# Altium footprint library PERCRO_footprints.PcbLib: 177 footprints (part 9 of 12)
Each footprint in its own frame and in the unit in brackets; x right, y up, seen from the top. Pads: shape width x height; smd on the part's side, far side on the other; paste and mask are expansions set on the pad; w line width, h text height; cw(c..) or ccw(c..) is an arc to the next point about the centre after c.
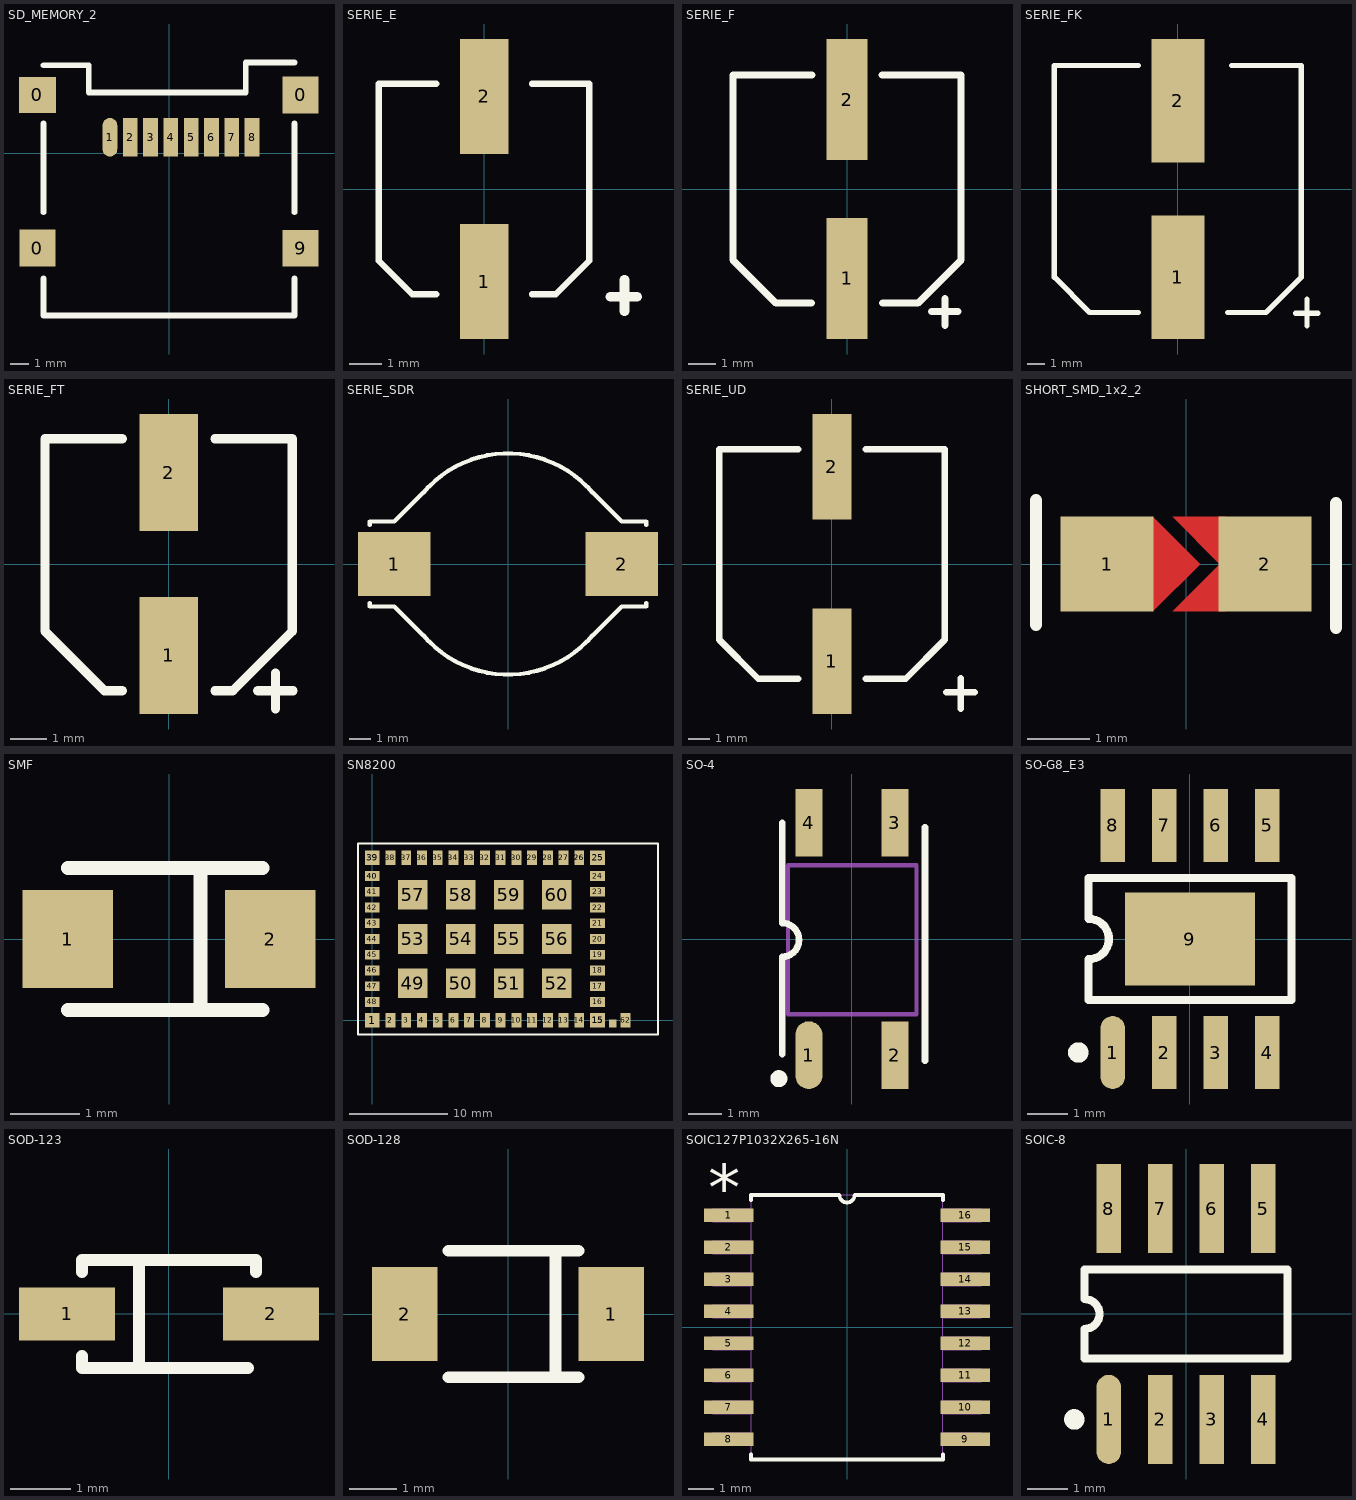
[diagram p8: the footprints below, top view; thin cyan lines are the x and y axes]

## SD_MEMORY_2 [mm] "500901-0801"
pads (12):
  rect 1.95x2 smd: 0(-7.125,-5.125) 0(7.125,3.175) 9(7.125,-5.133)
  rect 2x1.95 smd: 0(-7.125,3.175)
  oval 0.8x2.1 smd: 1(-3.2,0.875)
  rect 0.8x2.1 smd: 2(-2.1,0.875) 3(-1,0.875) 4(0.1,0.875) 5(1.2,0.875) 6(2.3,0.875) 7(3.4,0.875) 8(4.5,0.875)
Top Overlay:
  lines w0.305: -6.8,-6.775 -6.8,-8.775 6.8,-8.775 6.8,-6.775 ; -6.8,-3.175 -6.8,1.625 ; -6.8,4.774 -4.349,4.774 -4.349,3.299 4.149,3.299 4.149,4.924 6.8,4.924 ; 6.8,-3.175 6.8,1.625
3D body "SD MEMORY 2.stp": height 1.95, standoff 0, extent -7.3,-8.782 7.3,5.718

## SERIE_E [mm]
pads (2):
  rect 1.524x3.6 smd: 1(0,-2.9) 2(0,2.9)
Top Overlay:
  lines w0.2: -1.5,-3.3 -2.249,-3.3 -3.3,-2.249 -3.3,3.3 -1.5,3.3 ; 1.5,-3.3 2.249,-3.3 3.3,-2.249 3.3,3.3 1.5,3.3
  lines w0.3: 3.949,-3.374 4.799,-3.374 ; 4.399,-3.824 4.399,-2.849
3D body "Capacitor SMD SERIE E.STEP": height 5.4, standoff 0, extent -3.3,-3.5 3.3,3.5

## SERIE_F [mm] "Capacitor"
pads (2):
  rect 1.5x4.4 smd: 1(0,-3.25) 2(0,3.25)
Top Overlay:
  lines w0.254: -1.291,-4.15 -2.581,-4.15 -4.15,-2.581 -4.15,4.15 -1.27,4.15 ; 1.27,4.15 4.15,4.15 4.15,-2.581 2.581,-4.15 1.291,-4.15 ; 3.073,-4.454 4.034,-4.454 ; 3.556,-4.953 3.556,-3.971
3D body: height 10.2, standoff 0, extent -4,-3.997 4,3.997

## SERIE_FK [mm]
pads (2):
  rect 3x7 smd: 1(0,-5) 2(0,5)
Top Overlay:
  lines w0.3: -2.249,-7 -4.997,-7 -7,-4.997 -7,7 -2.249,7 ; 2.824,-7 4.997,-7 7,-4.997 7,7 3.049,7 ; 6.673,-7.048 7.923,-7.048 ; 7.323,-7.748 7.323,-6.248
3D body "Capacitor type FK size H.step": height 13.51, standoff 0, extent -6.769,-6.883 6.731,6.917

## SERIE_FT [mm]
pads (2):
  rect 1.6x3.2 smd: 1(0,-2.5) 2(0,2.5)
Top Overlay:
  lines w0.254: -1.27,-3.461 -1.753,-3.461 -3.378,-1.835 -3.378,3.423 -1.27,3.423 ; 1.27,-3.461 1.753,-3.461 3.378,-1.835 3.378,3.423 1.27,3.423 ; 2.438,-3.461 3.399,-3.461 ; 2.921,-3.96 2.921,-2.978
3D body "Capacito serie F Size D8.STEP": height 7.7, standoff 0, extent -3.298,-3.532 3.302,3.468

## SERIE_SDR [mm]
pads (2):
  rect 3.4x3 smd: 1(-5.35,0) 2(5.35,0)
Top Overlay:
  lines w0.2: -6.5,-1.829 -6.5,-2 -5.348,-2 -3.999,-3.349 ; -6.5,1.829 -6.5,2 -5.348,2 -3.999,3.349 ; -3.987,-3.339 ccw(c0,0) 3.987,-3.339 ; -3.987,3.339 cw(c0,0) 3.987,3.339 ; 3.999,-3.349 5.348,-2 6.5,-2 6.5,-1.829 ; 3.999,3.349 5.348,2 6.5,2 6.5,1.829
3D body "SERIE_SDR.STEP": height 5, standoff 0, extent -6.35,-5 6.35,5

## SERIE_UD [mil]
pads (2):
  rect 70x190 smd: 1(0,-175.2) 2(0,175.2)
Top Overlay:
  lines w11.81: -61.02,-206.69 -132.79,-206.69 -202.76,-136.72 -202.76,206.69 -61.02,206.69 ; 61.02,-206.69 132.79,-206.69 202.76,-136.72 202.76,206.69 61.02,206.69 ; 205.66,-231.24 256.82,-231.24 ; 232.22,-260.76 232.22,-205.66
3D body: height 413.43, standoff 0, extent -206.69,-232.32 206.69,232.25

## SHORT_SMD_1x2_2 [mm] "Header SMD, 2-Pin, 2mm Pitch"
pads (2):
  rect 1.5x1.53 smd: 1(-1.27,0) 2(1.27,0)
Top Layer:
  region: -0.216,0.762 0.635,0.762 0.635,-0.762 -0.216,-0.762 0.546,0
  region: -0.533,0.762 -0.533,-0.762 0.229,0
Top Overlay:
  lines w0.2: -2.413,-0.975 -2.413,1.025 ; 2.413,-1.025 2.413,0.975
Top Paste:
  region: -0.216,0.762 0.635,0.762 0.635,-0.762 -0.216,-0.762 0.546,0
  region: -0.533,0.762 -0.533,-0.762 0.229,0
Top Solder:
  region: -0.533,0.762 -0.533,-0.762 0.229,0
  region: -0.216,0.762 0.635,0.762 0.635,-0.762 -0.216,-0.762 0.546,0

## SMF [mm] "Diode_SMD"
pads (2):
  rect 1.3x1.4 smd: 1(-1.45,0) 2(1.45,0)
Top Overlay:
  lines w0.2: -1.45,-1.016 1.344,-1.016 ; -1.45,1.016 1.344,1.016 ; 0.45,-1.016 0.45,1.016
3D body "SMF.step": height 1.25, standoff 0, extent -1.95,-0.95 1.95,0.95

## SN8200 [mm]
pads (66):
  rect 1.5x1.5 smd: 1(0,0) 15(22.9,0) 15(22.9,0) 25(22.9,16.5) 39(0,16.5)
  rect 1x1.5 smd: 2(1.85,0) 2(1.85,0) 3(3.45,0) 4(5.05,0) 5(6.65,0) 6(8.25,0) 7(9.85,0) 8(11.45,0) 9(13.05,0) 10(14.65,0) 11(16.25,0) 12(17.85,0) 13(19.45,0) 14(21.05,0) 26(21.05,16.5) 26(21.05,16.5) 27(19.45,16.5) 28(17.85,16.5) 29(16.25,16.5) 30(14.65,16.5) 31(13.05,16.5) 32(11.45,16.5) 33(9.85,16.5) 34(8.25,16.5) 35(6.65,16.5) 36(5.05,16.5) 37(3.45,16.5) 38(1.85,16.5) 62(25.75,0)
  rect 1.5x1 smd: 16(22.9,1.85) 17(22.9,3.45) 18(22.9,5.05) 19(22.9,6.65) 20(22.9,8.25) 21(22.9,9.85) 22(22.9,11.45) 23(22.9,13.05) 24(22.9,14.65) 40(0,14.65) 40(0,14.65) 41(0,13.05) 42(0,11.45) 43(0,9.85) 44(0,8.25) 45(0,6.65) 46(0,5.05) 47(0,3.45) 48(0,1.85)
  rect 3x3 smd: 49(4.13,3.75) 50(9.01,3.75) 51(13.89,3.75) 52(18.77,3.75) 53(4.13,8.25) 54(9.01,8.25) 55(13.89,8.25) 56(18.77,8.25) 57(4.13,12.75) 58(9.01,12.75) 59(13.89,12.75) 60(18.77,12.75)
  rect 0.8x0.8 smd: 61(24.45,-0.35)
Top Overlay:
  lines w0.203: -1.45,-1.45 29.05,-1.45 29.05,17.95 -1.45,17.95 -1.45,-1.45
3D body "SN8200.STEP": height 2.9, standoff 0.2, extent -1.45,-1.45 29.05,18.05

## SO-4 [mm] "Opto-isolator"
pads (4):
  oval 0.8x2 smd: 1(-1.27,-3.429)
  rect 0.8x2 smd: 2(1.27,-3.429) 3(1.27,3.429) 4(-1.27,3.429)
Top Overlay:
  circle w0.254: c-2.158,-4.125 r0.125
  lines w0.2: -2.057,-3.399 -2.057,-0.525 ccw(c-2.058,-0.025) -2.057,0.475 -2.057,3.424 ; 2.159,-3.596 2.159,3.302
Mechanical 13:
  lines w0.127: -1.885,-2.225 1.905,-2.225 1.905,2.175 -1.885,2.175 -1.885,-2.225
3D body "HCPL-181-1.STEP": height 2.08, standoff -0.02, extent -1.8,-3.5 1.8,3.5

## SO-G8_E3 [mm]
pads (9):
  oval 0.6x1.8 smd: 1(-1.905,-2.8)
  rect 0.6x1.8 smd: 2(-0.635,-2.8) 3(0.635,-2.8) 4(1.905,-2.8) 5(1.905,2.8) 6(0.635,2.8) 7(-0.635,2.8) 8(-1.905,2.8)
  rect 3.2x2.3 smd: 9(0,0)
Top Overlay:
  circle w0.254: c-2.755,-2.8 r0.125
  lines w0.2: -2.5,-1.5 2.5,-1.5 2.5,1.5 -2.5,1.5 -2.5,0.5 cw(c-2.5,0) -2.5,-0.5 -2.5,-1.5
3D body "SO-G8 E3 (HSOP8).STEP": height 1.75, standoff 0, extent -2.5,-3.1 2.5,3.1

## SOD-123 [mm]
pads (2):
  rect 1.6x0.889 smd: 1(-1.7,0) 2(1.7,0)
Top Overlay:
  lines w0.2: -1.45,-0.7 -1.45,-0.9 1.321,-0.9 ; -1.45,0.7 -1.45,0.9 1.45,0.9 1.45,0.7 ; -0.5,-0.9 -0.5,0.9
3D body "SOD-123.step": height 1.45, standoff 0, extent -1.925,-0.85 1.925,0.85

## SOD-128 [mm]
pads (2):
  rect 1.4x2 smd: 1(2.2,0) 2(-2.2,0)
Top Overlay:
  lines w0.254: -1.27,-1.35 1.5,-1.35 ; -1.27,1.35 1.5,1.35 ; 1.016,-1.35 1.016,-0.675 1.016,0.675 1.016,1.35
3D body: height 1, standoff 0, extent -1.905,-1.346 1.905,1.346

## SOIC127P1032X265-16N [mil]
pads (16):
  rect 78x21 smd: 1(-185,175) 2(-185,125) 3(-185,75) 4(-185,25) 5(-185,-25) 6(-185,-75) 7(-185,-125) 8(-185,-175) 9(185,-175) 10(185,-125) 11(185,-75) 12(185,-25) 13(185,25) 14(185,75) 15(185,125) 16(185,175)
Top Overlay:
  lines w6: -150,-199 -150,-207 150,-207 150,-199 ; -150,199 -150,207 -12,207 ccw(c0,207) 12,207 150,207 150,199
  text "*" at -217.4,181.51 h73.82
Mechanical 4:
  lines w0: -210,-185 -210,-165 ; -210,-185 -150,-185 ; -210,-185 -210,-165 ; -210,-185 -150,-185 ; -210,-165 -150,-165 ; -210,-165 -150,-165 ; -210,-135 -210,-115 ; -210,-135 -150,-135 ; -210,-135 -210,-115 ; -210,-135 -150,-135 ; -210,-115 -150,-115 ; -210,-115 -150,-115 ; -210,-85 -210,-65 ; -210,-85 -150,-85 ; -210,-85 -210,-65 ; -210,-85 -150,-85 ; -210,-65 -150,-65 ; -210,-65 -150,-65 ; -210,-35 -210,-15 ; -210,-35 -150,-35 ; -210,-35 -210,-15 ; -210,-35 -150,-35 ; -210,-15 -150,-15 ; -210,-15 -150,-15 ; -210,15 -210,35 ; -210,15 -150,15 ; -210,15 -210,35 ; -210,15 -150,15 ; -210,35 -150,35 ; -210,35 -150,35 ; -210,65 -210,85 ; -210,65 -150,65 ; -210,65 -210,85 ; -210,65 -150,65 ; -210,85 -150,85 ; -210,85 -150,85 ; -210,115 -210,135 ; -210,115 -150,115 ; -210,115 -210,135 ; -210,115 -150,115 ; -210,135 -150,135 ; -210,135 -150,135 ; -210,165 -210,185 ; -210,165 -150,165 ; -210,165 -210,185 ; -210,165 -150,165 ; -210,185 -150,185 ; -210,185 -150,185 ; -150,-207 150,-207 ; -150,-207 -150,207 ; -150,-207 150,-207 ; -150,-207 -150,207 ; -150,-185 -150,-165 ; -150,-185 -150,-165 ; -150,-135 -150,-115 ; -150,-135 -150,-115 ; -150,-85 -150,-65 ; -150,-85 -150,-65 ; -150,-35 -150,-15 ; -150,-35 -150,-15 ; -150,15 -150,35 ; -150,15 -150,35 ; -150,65 -150,85 ; -150,65 -150,85 ; -150,115 -150,135 ; -150,115 -150,135 ; -150,165 -150,185 ; -150,165 -150,185 ; -150,207 -12,207 ; -150,207 -12,207 ; -12,207 ccw(c0,207) 12,207 ; -12,207 ccw(c0,207) 12,207 ; -12,207 12,207 ; -12,207 12,207 ; 12,207 150,207 ; 12,207 150,207 ; 150,-207 150,207 ; 150,-207 150,207 ; 150,-185 150,-165 ; 150,-185 210,-185 ; 150,-185 150,-165 ; 150,-185 210,-185 ; 150,-165 210,-165 ; 150,-165 210,-165 ; 150,-135 150,-115 ; 150,-135 210,-135 ; 150,-135 150,-115 ; 150,-135 210,-135 ; 150,-115 210,-115 ; 150,-115 210,-115 ; 150,-85 150,-65 ; 150,-85 210,-85 ; 150,-85 150,-65 ; 150,-85 210,-85 ; 150,-65 210,-65 ; 150,-65 210,-65 ; 150,-35 150,-15 ; 150,-35 210,-35 ; 150,-35 150,-15 ; 150,-35 210,-35 ; 150,-15 210,-15 ; 150,-15 210,-15 ; 150,15 150,35 ; 150,15 210,15 ; 150,15 150,35 ; 150,15 210,15 ; 150,35 210,35 ; 150,35 210,35 ; 150,65 150,85 ; 150,65 210,65 ; 150,65 150,85 ; 150,65 210,65 ; 150,85 210,85 ; 150,85 210,85 ; 150,115 150,135 ; 150,115 210,115 ; 150,115 150,135 ; 150,115 210,115 ; 150,135 210,135 ; 150,135 210,135 ; 150,165 150,185 ; 150,165 210,165 ; 150,165 150,185 ; 150,165 210,165 ; 150,185 210,185 ; 150,185 210,185 ; 210,-185 210,-165 ; 210,-185 210,-165 ; 210,-135 210,-115 ; 210,-135 210,-115 ; 210,-85 210,-65 ; 210,-85 210,-65 ; 210,-35 210,-15 ; 210,-35 210,-15 ; 210,15 210,35 ; 210,15 210,35 ; 210,65 210,85 ; 210,65 210,85 ; 210,115 210,135 ; 210,115 210,135 ; 210,165 210,185 ; 210,165 210,185
  text "*" at -217.29,181.41 h73.82
  text "*" at -217.29,181.41 h73.82
3D body "SOIC16_Wide_JEDEC_MS-013AA.step": height 104.33, standoff 0, extent -209.24,-206.69 209.26,206.7

## SOIC-8 [mm]
pads (8):
  oval 0.6x2.2 smd: 1(-1.905,-2.6)
  rect 0.6x2.2 smd: 2(-0.635,-2.6) 3(0.635,-2.6) 4(1.905,-2.6) 5(1.905,2.6) 6(0.635,2.6) 7(-0.635,2.6) 8(-1.905,2.6)
Top Overlay:
  circle w0.254: c-2.755,-2.6 r0.125
  lines w0.2: -2.5,-1.1 2.5,-1.1 2.5,1.1 -2.5,1.1 -2.5,0.367 cw(c-2.5,0) -2.5,-0.367 -2.5,-1.1
3D body "SOIC-8.step": height 1.75, standoff 0, extent -2.45,-3 2.45,3